# Altium footprint library PcbLib1.PcbLib: 51 footprints (part 1 of 4)
Each footprint in its own frame and in the unit in brackets; x right, y up, seen from the top. Pads: shape width x height; smd on the part's side, far side on the other; paste and mask are expansions set on the pad; w line width, h text height; cw(c..) or ccw(c..) is an arc to the next point about the centre after c.
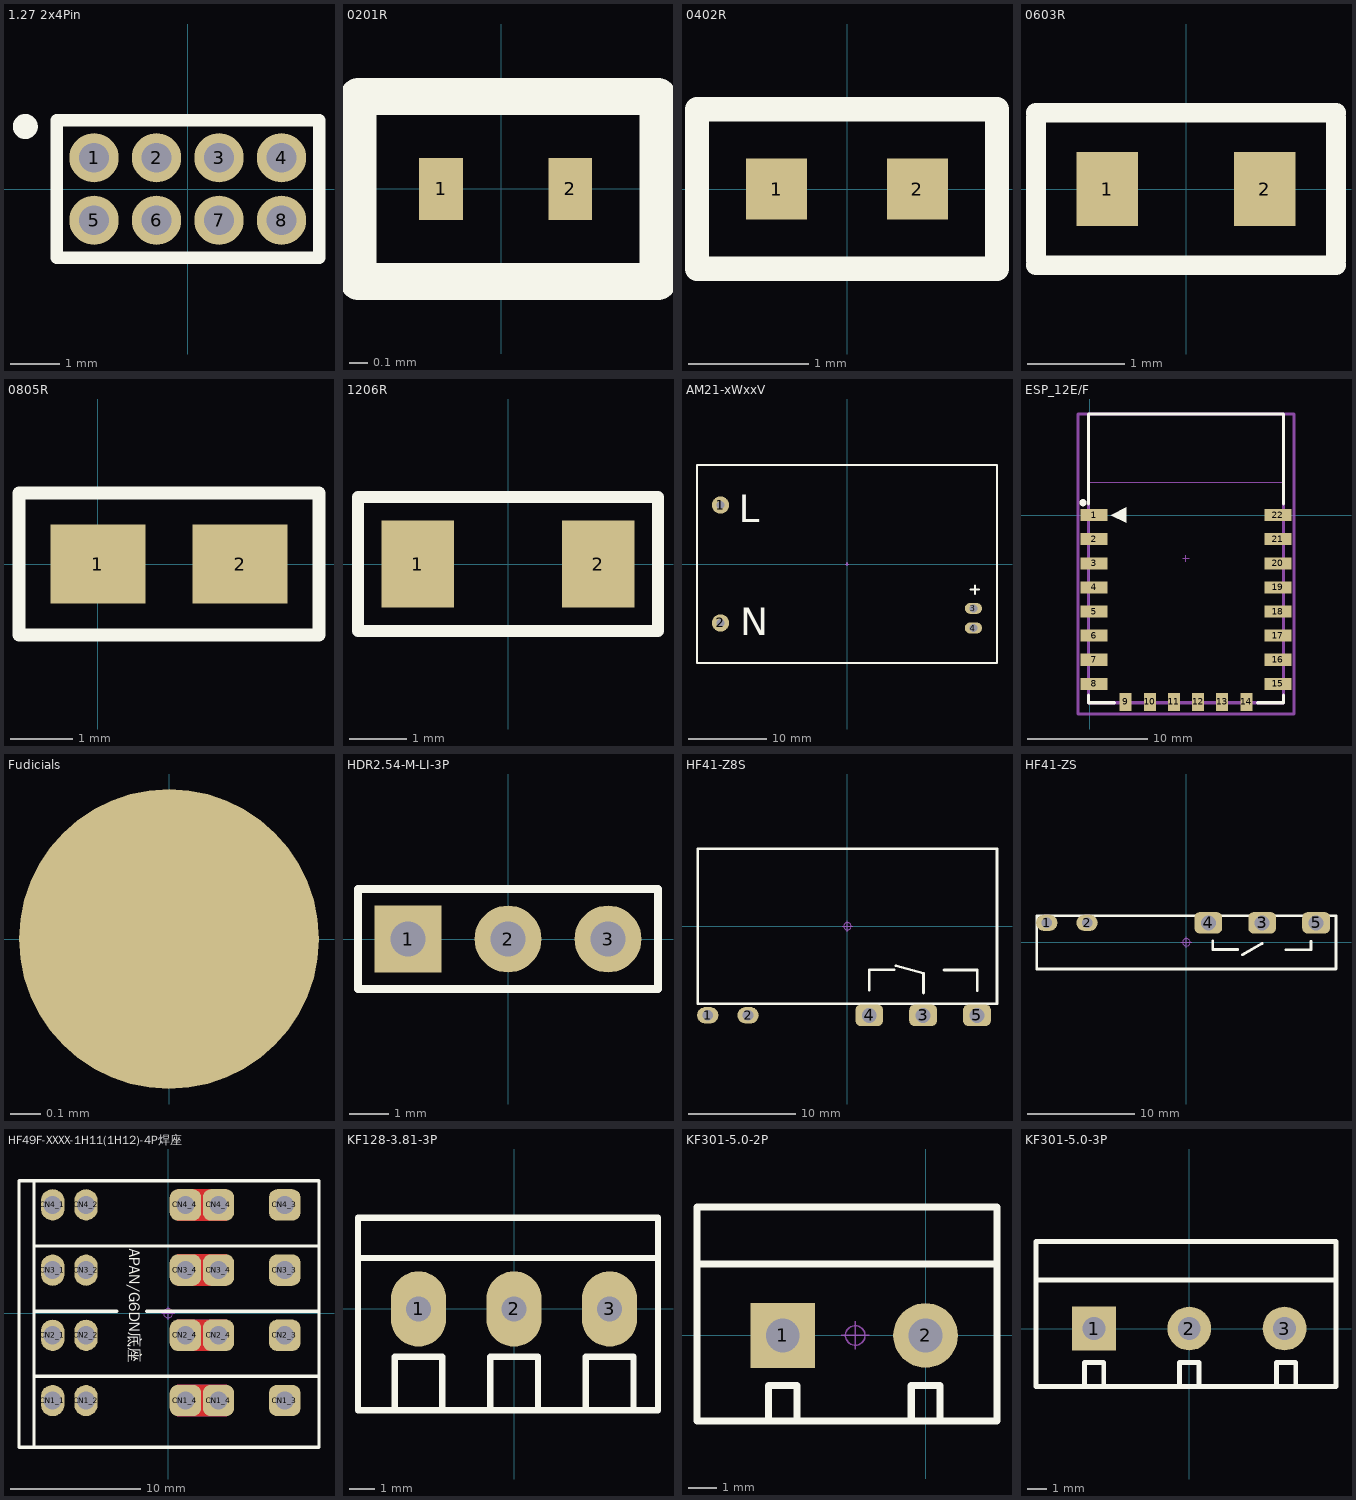
[diagram p0: the footprints below, top view; thin cyan lines are the x and y axes]

## 1.27 2x4Pin [mm] "烧录接口"
pads (8):
  round 1 / inner round 1 / far side round 0.5 hole 0.6: 1(-1.905,0.635)
  round 1 / inner round 1 / far side round 0.6 hole 0.6: 2(-0.635,0.635) 3(0.635,0.635) 4(1.905,0.635) 5(-1.905,-0.635) 6(-0.635,-0.635) 7(0.635,-0.635) 8(1.905,-0.635)
Top Overlay:
  circle w0.254: c-3.302,1.27 r0.127
  lines w0.254: -2.667,-1.397 -2.667,0.127 -2.667,1.397 2.667,1.397 2.667,-1.397 -2.667,-1.397 ; -0.635,-0.635 -0.635,-0.635 ; 0.635,0.635 0.635,0.635

## 0201R [mil]
pads (2):
  rect 9.5x13.5 smd: 1(-13,0) 2(15,0)
Top Overlay:
  lines w7.99: -31,-20 34,-20 34,20 -31,20 -31,-20
3D body "RESC0603(0201).STEP": height 9.84, standoff -0.39, extent -10.81,-5.9 12.82,5.91

## 0402R [mil]
pads (2):
  rect 20x20 smd: 1(-23,0) 2(23,0)
Top Overlay:
  lines w8: -49,-26 15,-26 49,-26 49,26 15,26 -49,26 -49,-26
3D body "R0402.STEP": height 13.78, standoff 0, extent -19.68,-9.84 19.69,9.85

## 0603R [mil]
pads (2):
  rect 25x30 smd: 1(-32,0) 2(32,0)
Top Overlay:
  lines w8: -61,-31 13,-31 61,-31 ; -61,-29 -61,29 ; -61,31 13,31 61,31 ; 61,-29 61,29
3D body "R0603.STEP": height 17.72, standoff 0, extent -32.49,-15.74 30.5,15.75

## 0805R [mil]
pads (2):
  rect 60x50 smd: 1(0,0) 2(90,0)
Top Overlay:
  lines w8: -50,-45 -50,45 65,45 140,45 140,-45 65,-45 -50,-45
3D body "R0805.STEP": height 21.65, standoff 0, extent 4.64,-24.8 83.37,24.81

## 1206R [mil]
pads (2):
  rect 50x60 smd: 1(-62,0) 2(62,0)
Top Overlay:
  lines w8: -103,-46 40,-46 103,-46 103,46 40,46 -103,46 -103,-46
3D body "R1206.STEP": height 23.62, standoff 0, extent -63.98,-32.49 62,30.51

## AM21-xWxxV [mm] "亿佰特生产的AC-DC降压模块专用封装"
height 23
pads (4):
  round 2.2 hole 1: 1(-16.1,7.5) 2(-16.1,-7.5)
  oval 2.2x1.4 hole 1: 3(16.1,-5.65) 4(16.1,-8.15)
Top Overlay:
  lines w0.254: 15.75,-3.275 16.825,-3.275 ; 16.1,-12.6 19.1,-12.6 ; 16.327,-3.839 16.327,-2.764 ; 19.1,-12.6 19.1,12.6 -19.1,12.6 -19.1,-12.6 0,-12.6 19.1,-12.6
  text "L" at -13.8,5.3 h3.5
  text "N" at -13.6,-9.1 h3.5
Mechanical 15:
  circle w0.025: c0,0 r0.127
  lines w0.025: -0.2,0 0.2,0 ; 0,-0.2 0,0.2
3D body "Part2.SLDPRT": height 23, standoff -5, extent -19.1,-12.6 19.1,12.6

## ESP_12E/F [mm] "ESP-12 Wi-Fi Module by AI-Thinker"
height 3.2
pads (22):
  rect 2.25x1 smd: 1(0.375,0) 2(0.375,-2) 3(0.375,-4) 4(0.375,-6) 5(0.375,-8) 6(0.375,-10) 7(0.375,-12) 8(0.375,-14) 15(15.625,-14) 16(15.625,-12) 17(15.625,-10) 18(15.625,-8) 19(15.625,-6) 20(15.625,-4) 21(15.625,-2) 22(15.625,0)
  rect 1x1.5 smd: 9(3,-15.5) 10(5,-15.5) 11(7,-15.5) 12(9,-15.5) 13(11,-15.5) 14(13,-15.5)
Top Overlay:
  circle w0.3: c-0.55,1.025 r0.15
  region: 1.77,0 3.04,-0.635 3.04,0.635
  lines w0.254: -0.084,-14.916 -0.084,-15.568 2.068,-15.568 ; -0.084,0.916 -0.084,8.371 16.084,8.371 16.084,0.916 ; 13.932,-15.568 16.084,-15.568 16.084,-14.916
Mechanical 13:
  lines w0.051: -0.127,2.727 -0.127,8.382 16.129,8.382 16.129,2.727 -0.127,2.727
  lines w0.254: -0.084,-15.568 16.084,-15.568 16.084,8.371 -0.084,8.371 -0.084,-15.568
  text "CUTOUT POLYGON" at 0.127,7.366 h0.25
  text "ANTENNA AREA" at 0.127,7.874 h0.25
Mechanical 15:
  lines w0.1: 7.746,-3.598 8.254,-3.598 ; 8,-3.852 8,-3.344
  lines w0.254: -0.975,-16.5 -0.975,8.371 16.975,8.371 16.975,-16.5 -0.975,-16.5
3D body "ESP_12_E.STEP": height 2.75, standoff 0.04, extent 0.001,-15.491 16.001,8.509

## Fudicials [mm] "SMT基准点"
pads (1):
  round 1 smd mask+1: ""(0,0)

## HDR2.54-M-LI-3P [mm] "排母，3脚"
pads (3):
  rect 1.7x1.7 hole 0.9: 1(-2.54,0)
  round 1.7 hole 0.9: 2(0,0) 3(2.54,0)
Top Overlay:
  lines w0.2: -3.81,-1.27 3.81,-1.27 3.81,1.27 -3.81,1.27 -3.81,-1.27
3D body "HDR2.54-1P_M.STEP": height 8.5, standoff -3, extent -1.27,-1.27 1.27,1.27
3D body "HDR2.54-1P_M.STEP": height 8.5, standoff -3, extent -3.81,-1.27 -1.27,1.27
3D body "HDR2.54-1P_M.STEP": height 8.5, standoff -3, extent 1.27,-1.27 3.81,1.27

## HF41-Z8S [mm] "卧式继电器(28*15*5,含引脚厚0.2+0.3)"
height 5
pads (5):
  oval 2x1.524 hole 1: 1(-13.076,-8.331) 2(-9.296,-8.331)
  rrect50% 2.6x2 hole 1.4: 3(7.084,-8.331) 4(2.044,-8.331) 5(12.124,-8.331)
Top Overlay:
  lines w0.254: 2.057,-5.969 2.057,-4.064 4.394,-4.064 ; 4.541,-3.705 7.112,-4.394 7.112,-6.248 ; 9.042,-4.089 12.141,-4.089 ; 12.141,-6.02 12.141,-4.115 ; -14,-7.25 -14,0 -14,7.25 0,7.25 14,7.25 14,0 14,-7.25 0,-7.25 -14,-7.25
Mechanical 15:
  circle w0.05: c0,0 r0.35
  lines w0.05: -0.5,0 0.5,0 ; 0,-0.5 0,0.5
3D body "Part1.SLDPRT": height 5, standoff -3, extent -14,-8.374 14,7.126

## HF41-ZS [mm] "立式继电器(28*15*5)"
height 15
pads (5):
  oval 2x1.524 hole 1: 1(-13.06,1.825) 2(-9.28,1.825)
  rrect50% 2.6x2 hole 1.4: 3(7.1,1.825) 4(2.06,1.825) 5(12.14,1.825)
Top Overlay:
  lines w0.254: 2.463,0.137 2.463,-0.675 4.8,-0.675 ; 5.253,-1.166 7.1,-0.1 ; 9.322,-0.7 11.658,-0.7 11.658,0.112 ; -14,-2.5 0,-2.5 14,-2.5 14,0 14,2.5 0,2.5 -14,2.5 -14,0 -14,-2.5
Mechanical 15:
  circle w0.05: c0,0 r0.35
  lines w0.05: -0.5,0 0.5,0 ; 0,-0.5 0,0.5
3D body "Part2.SLDPRT": height 15, standoff -3.3, extent -14,-2.5 14,2.5

## HF49F-XXXX-1H11(1H12)-4P焊座 [mm] "用于HF49F-XXXX-1H11(1H12)的焊座，兼容引出脚5.08mm和7.62mm"
height 14.4
pads (20):
  oval 1.8x2.4 hole 1.4: CN1_1(-8.853,-6.698) CN1_2(-6.293,-6.698) CN2_1(-8.853,-1.698) CN2_2(-6.293,-1.698) CN3_1(-8.853,3.302) CN3_2(-6.293,3.302) CN4_1(-8.853,8.302) CN4_2(-6.293,8.302)
  rrect50% 2.4x2.4 hole 1.4: CN1_3(8.947,-6.698) CN1_4(1.327,-6.698) CN1_4(3.867,-6.698) CN2_3(8.947,-1.698) CN2_4(1.327,-1.698) CN2_4(3.867,-1.698) CN3_3(8.947,3.302) CN3_4(1.327,3.302) CN3_4(3.867,3.302) CN4_3(8.947,8.302) CN4_4(1.327,8.302) CN4_4(3.867,8.302)
Top Layer:
  region: 4.502,-7.898 0.692,-7.898 0.692,-5.498 4.502,-5.498
  region: 4.502,-2.898 0.692,-2.898 0.692,-0.498 4.502,-0.498
  region: 4.502,2.102 0.692,2.102 0.692,4.502 4.502,4.502
  region: 4.502,7.102 0.692,7.102 0.692,9.502 4.502,9.502
Bottom Layer:
  region: 4.502,-7.898 0.692,-7.898 0.692,-5.498 4.502,-5.498
  region: 4.502,-2.898 0.692,-2.898 0.692,-0.498 4.502,-0.498
  region: 4.502,2.102 0.692,2.102 0.692,4.502 4.502,4.502
  region: 4.502,7.102 0.692,7.102 0.692,9.502 4.502,9.502
Top Overlay:
  lines w0.254: -11.43,-10.287 -11.43,10.16 ; -11.43,-10.274 11.57,-10.274 11.57,10.16 -11.43,10.16 ; -10.287,-10.287 -10.287,10.16 11.517,10.16 ; -10.287,-4.847 11.491,-4.847 ; -10.287,10.153 -10.287,5.153 11.491,5.153 ; -10.273,0.153 -3.937,0.153 ; -8.93,10.16 -11.43,10.16 ; -1.651,0.153 11.491,0.153
  text "APAN/G6DN底座" at -3.283,4.952 h1.5
Mechanical 15:
  circle w0.05: c0,0 r0.35
  lines w0.05: -0.5,0 0.5,0 ; 0,-0.5 0,0.5
3D body "Part1.SLDPRT": height 15.5, standoff 0, extent -11.43,-10.274 11.57,10.226

## KF128-3.81-3P [mm] "螺钉式接线端子，脚距3.81mm"
pads (3):
  oval 2.2x3 hole 1: 1(-3.81,0) 2(0,0) 3(3.81,0)
Top Overlay:
  lines w0.254: -6.223,2.032 5.74,2.032 ; -4.763,-4.039 -4.763,-1.905 -2.857,-1.905 -2.857,-4.039 ; -0.953,-4.039 -0.953,-1.905 0.953,-1.905 0.953,-4.039 ; 2.857,-4.039 2.857,-1.905 4.763,-1.905 4.763,-4.039 ; -6.223,-4.039 5.74,-4.039 5.74,3.632 -6.223,3.632 -6.223,-4.039
Mechanical 15:
  circle w0.05: c0,0 r0.35
  lines w0.05: -0.5,0 0.5,0 ; 0,-0.5 0,0.5
3D body "KF128.STEP": height 8.55, standoff -3.95, extent 1.405,-3.9 5.715,3.5
3D body "KF128.STEP": height 8.55, standoff -3.95, extent -6.215,-3.9 -1.905,3.5
3D body "KF128.STEP": height 8.55, standoff -3.95, extent -2.405,-3.9 1.905,3.5

## KF301-5.0-2P [mm] "可拼接端子/6A"
pads (2):
  rect 2.3x2.3 hole 1.2: 1(-5.08,0)
  round 2.3 hole 1.2: 2(0,0)
Top Overlay:
  lines w0.254: -8.128,2.54 2.54,2.54 ; -5.588,-3.048 -5.588,-1.778 -4.572,-1.778 -4.572,-3.048 ; -0.508,-3.048 -0.508,-1.778 0.508,-1.778 0.508,-3.048 ; -8.128,-3.048 2.54,-3.048 2.54,4.572 -8.128,4.572 -8.128,-3.048
Mechanical 15:
  circle w0.05: c-2.5,0 r0.35
  lines w0.05: -3,0 -2,0 ; -2.5,-0.5 -2.5,0.5
3D body "KF301.STEP": height 10.05, standoff -3.75, extent -2.95,-3 2.55,4.6
3D body "KF301.STEP": height 10.05, standoff -3.75, extent -7.95,-3 -2.45,4.6

## KF301-5.0-3P [mm] "可拼接端子/6A"
pads (3):
  rect 2.3x2.3 hole 1.2: 1(-5,0)
  round 2.3 hole 1.2: 2(0,0) 3(5,0)
Top Overlay:
  lines w0.254: -8.048,2.54 7.7,2.54 ; -5.508,-3.048 -5.508,-1.778 -4.492,-1.778 -4.492,-3.048 ; -0.508,-3.048 -0.508,-1.778 0.508,-1.778 0.508,-3.048 ; 4.572,-3.048 4.572,-1.778 5.588,-1.778 5.588,-3.048 ; -8.048,-3.048 7.7,-3.048 7.7,4.572 -8.048,4.572 -8.048,-3.048
Mechanical 15:
  circle w0.05: c0,0 r0.35
  lines w0.05: -0.5,0 0.5,0 ; 0,-0.5 0,0.5
3D body "KF301.STEP": height 10.05, standoff -3.75, extent -7.87,-3 -2.37,4.6
3D body "KF301.STEP": height 10.05, standoff -3.75, extent -2.87,-3 2.63,4.6
3D body "KF301.STEP": height 10.05, standoff -3.75, extent 2.13,-3 7.63,4.6